# Altium footprint library SMT.PcbLib: 325 footprints (part 7 of 21)
Each footprint in its own frame and in the unit in brackets; x right, y up, seen from the top. Pads: shape width x height; smd on the part's side, far side on the other; paste and mask are expansions set on the pad; w line width, h text height; cw(c..) or ccw(c..) is an arc to the next point about the centre after c.
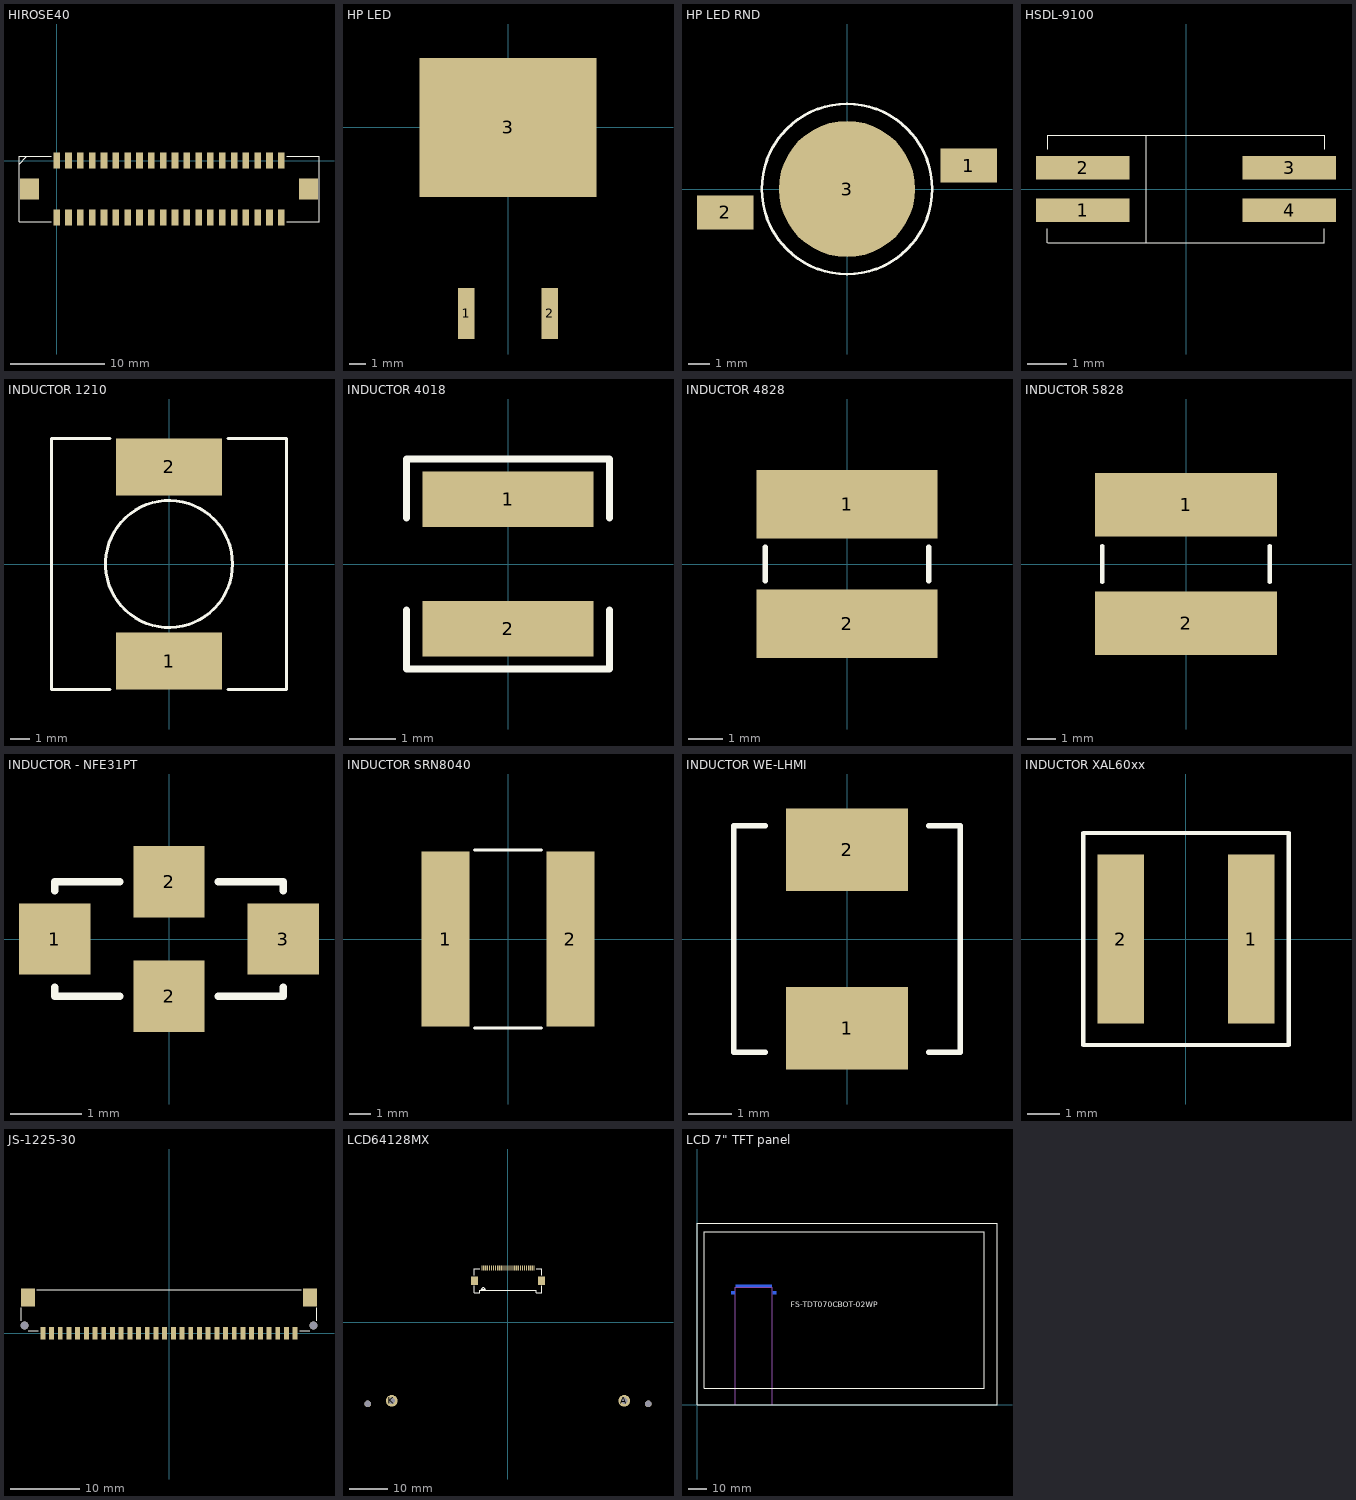
[diagram p6: the footprints below, top view; thin cyan lines are the x and y axes]

## HIROSE40 [mm]
pads (42):
  rect 0.7x1.7 smd: 1(0,0) 2(0,-6) 3(1.25,0) 4(1.25,-6) 5(2.5,0) 6(2.5,-6) 7(3.75,0) 8(3.75,-6) 9(5,0) 10(5,-6) 11(6.25,0) 12(6.25,-6) 13(7.5,0) 14(7.5,-6) 15(8.75,0) 16(8.75,-6) 17(10,0) 18(10,-6) 19(11.25,0) 20(11.25,-6) 21(12.5,0) 22(12.5,-6) 23(13.75,0) 24(13.75,-6) 25(15,0) 26(15,-6) 27(16.25,0) 28(16.25,-6) 29(17.5,0) 30(17.5,-6) 31(18.75,0) 32(18.75,-6) 33(20,0) 34(20,-6) 35(21.25,0) 36(21.25,-6) 37(22.5,0) 38(22.5,-6) 39(23.75,0) 40(23.75,-6)
  rect 2x2.2 smd: ""(-2.86,-3) ""(26.6,-3)
TopOverlay:
  lines w0.127: -3.99,-0.36 -3.18,0.45 ; -0.56,-6.45 -3.99,-6.45 -3.99,0.45 -0.56,0.45 ; 24.3,-6.45 27.73,-6.45 27.73,0.45 24.3,0.45

## HP LED [mm]
pads (3):
  rect 1x3.1 smd: 1(-2.54,-11.25) 2(2.54,-11.25)
  rect 10.7x8.4 smd: 3(0,0)

## HP LED RND [mm]
pads (3):
  rect 2.65x1.6 smd: 1(5.72,1.1) 2(-5.72,-1.1)
  round 6.4 smd: 3(0,0)
TopOverlay:
  circle w0.127: c0,0 r4

## HSDL-9100 [mm] "Surface-Mount Proximity Sensor"
height 2.7
pads (4):
  rect 2.4x0.6 smd: 1(-2.65,-0.55) 2(-2.65,0.55) 3(2.65,0.55) 4(2.65,-0.55)
TopOverlay:
  lines w0.025: -3.556,-1.375 -3.556,-1.016 ; -3.55,-1.375 0,-1.375 3.55,-1.375 ; -3.55,1.375 0,1.375 3.55,1.375 ; -3.544,1.016 -3.544,1.375 ; -1.016,-1.375 -1.016,1.375 ; 3.544,-1.375 3.544,-1.016 ; 3.556,1.016 3.556,1.375

## INDUCTOR 1210 [mm] "SIZE 1210"
height 0.254
pads (2):
  rect 5.4x2.9 smd: 1(0,-4.95) 2(0,4.95)
TopOverlay:
  circle w0.152: c0,0 r3.239
  lines w0.152: -3,-6.4 -6,-6.4 -6,6.4 -3,6.4 ; 3,-6.4 6,-6.4 6,6.4 3,6.4
3D body "STEP-WE-PD-1210-rev1.stp": height 10.43, standoff 0.05, extent -6,-6 6,6

## INDUCTOR 4018 [mm] "SMD SIZE 54018"
height 3.9
pads (2):
  rect 3.7x1.2 smd: 1(0,1.4) 2(0,-1.4)
TopOverlay:
  lines w0.152: -2.2,-1 -2.2,-2.275 2.2,-2.275 2.2,-1 ; -2.2,1 -2.2,2.275 2.2,2.275 2.2,1
3D body: height 2.8, standoff 0, extent -2,-2 2,2

## INDUCTOR 4828 [mm] "SMD 744043101 SIZE 5828"
height 2.8
pads (2):
  rect 5.3x2 smd: 1(0,1.75) 2(0,-1.75)
TopOverlay:
  lines w0.152: -2.4,-0.5 -2.4,0 -2.4,0.5 ; 2.4,-0.5 2.4,0 2.4,0.5
3D body: height 2.8, standoff 0, extent -2.4,-2.4 2.4,2.4

## INDUCTOR 5828 [mm] "SMD 744053221 SIZE 5828"
height 2.8
pads (2):
  rect 6.3x2.2 smd: 1(0,2.05) 2(0,-2.05)
TopOverlay:
  lines w0.152: -2.9,-0.625 -2.9,0 -2.9,0.625 ; 2.9,-0.625 2.9,0 2.9,0.625
3D body: height 2.8, standoff 0, extent -2.9,-2.9 2.9,2.9

## INDUCTOR - NFE31PT [mm] "NFE31PT (1206)"
pads (4):
  rect 1x1 smd: 1(-1.6,0) 2(0,-0.8) 2(0,0.8) 3(1.6,0)
TopOverlay:
  lines w0.102: -1.6,-0.675 -1.6,-0.8 -0.686,-0.8 ; -1.6,0.675 -1.6,0.8 -0.686,0.8 ; 0.686,-0.8 1.6,-0.8 1.6,-0.675 ; 0.686,0.8 1.6,0.8 1.6,0.675
3D body: height 1.4, standoff 0.2, extent -1.6,-0.598 1.6,0.598
3D body: height 1.6, standoff 0, extent -1.6,-0.794 -0.9,0.8
3D body: height 1.6, standoff 0, extent 0.9,-0.797 1.6,0.797
3D body: height 1.6, standoff 0, extent -0.508,-0.8 0.508,0.8

## INDUCTOR SRN8040 [mm] "BOURNS SRN8040 SERIES"
height 4
pads (2):
  rect 2.2x8 smd: 1(-2.85,0) 2(2.85,0)
TopOverlay:
  lines w0.127: -1.524,-4.064 1.524,-4.064 ; -1.524,4.064 1.524,4.064

## INDUCTOR WE-LHMI [mm]
height 1.8
pads (2):
  rect 2.8x1.9 smd: 1(0,-2.05) 2(0,2.05)
TopOverlay:
  lines w0.127: -1.875,-2.6 -2.6,-2.6 -2.6,0 -2.6,2.6 -1.875,2.6 ; 1.875,-2.6 2.6,-2.6 2.6,0 2.6,2.6 1.875,2.6
3D body: height 1.8, standoff 0, extent -2.6,-2.6 2.6,2.6

## INDUCTOR XAL60xx [mm]
height 6.1
pads (2):
  rect 1.43x5.24 smd: 1(2.02,0) 2(-2.02,0)
TopOverlay:
  lines w0.127: -3.18,-3.28 -3.18,3.28 0,3.28 3.18,3.28 3.18,-3.28 0,-3.28 -3.18,-3.28
3D body: height 6.1, standoff 0, extent -3.18,-3.28 3.18,3.28

## JS-1225-30 [mm] "LVDS HEADER 30 WAY"
height 2.5
pads (34):
  rect 0.7x1.8 smd: 1(18.125,0) 2(16.875,0) 3(15.625,0) 4(14.375,0) 5(13.125,0) 6(11.875,0) 7(10.625,0) 8(9.375,0) 9(8.125,0) 10(6.875,0) 11(5.625,0) 12(4.375,0) 13(3.125,0) 14(1.875,0) 15(0.625,0) 16(-0.625,0) 17(-1.875,0) 18(-3.125,0) 19(-4.375,0) 20(-5.625,0) 21(-6.875,0) 22(-8.125,0) 23(-9.375,0) 24(-10.625,0) 25(-11.875,0) 26(-13.125,0) 27(-14.375,0) 28(-15.625,0) 29(-16.875,0) 30(-18.125,0)
  round 1.1 hole 1.1 unplated: ""(-20.75,1.1) ""(20.75,1.1)
  rect 2x2.6 smd: ""(-20.25,5.1) ""(20.25,5.1)
TopOverlay:
  lines w0.152: -21.25,1.75 -21.25,3.625 ; -20.25,0.375 -18.75,0.375 ; -19,6.25 19,6.25 ; 18.75,0.375 20.25,0.375 ; 21.25,1.75 21.25,3.625

## L298P [mm] "PowerS020"
height 3.6

## LCD64128MX [mm] "DISPLAYTECH 64X128 GRAPHIC LCD"
height 6.5
pads (34):
  rect 0.3x1.3 smd: 1(-6.75,13.993) 2(-6.25,13.993) 3(-5.75,13.993) 4(-5.25,13.993) 5(-4.75,13.993) 6(-4.25,13.993) 7(-3.75,13.993) 8(-3.25,13.993) 9(-2.75,13.993) 10(-2.25,13.993) 11(-1.75,13.993) 12(-1.25,13.993) 13(-0.75,13.993) 14(-0.25,13.993) 15(0.25,13.993) 16(0.75,13.993) 17(1.25,13.993) 18(1.75,13.993) 19(2.25,13.993) 20(2.75,13.993) 21(3.25,13.993) 22(3.75,13.993) 23(4.25,13.993) 24(4.75,13.993) 25(5.25,13.993) 26(5.75,13.993) 27(6.25,13.993) 28(6.75,13.993)
  round 3 hole 1.6: A(30,-20.293) K(-30,-20.293)
  round 1.7 hole 1.7 unplated: ""(-36.2,-21.093) ""(36.2,-21.093)
  rect 1.8x2.2 smd: ""(-8.65,10.743) ""(8.65,10.743)
TopOverlay:
  lines w0.127: -8.65,9.368 -8.65,7.643 -7.25,7.643 ; -8.65,12.118 -8.65,13.843 -7.25,13.843 ; 7.25,13.843 8.65,13.843 8.65,12.118 ; 8.65,9.368 8.65,7.643 7.25,7.643 ; -7.25,7.643 -7.25,8.243 7.25,8.243 7.25,7.643 ; -7.25,7.643 -7.25,7.643 ; -6.375,8.993 -6.875,8.493 -5.875,8.493 -6.375,8.993 ; -6.375,8.993 -6.375,8.993 ; 7.25,7.643 7.25,7.643
BottomOverlay:
  lines w0.127: -38.7,-24.093 38.7,-24.093 38.7,28.307 -38.7,28.307 -38.7,-24.093 ; -33.26,-11.013 -33.26,22.227 0,22.227 33.26,22.227 33.26,-11.013 -33.26,-11.013

## LCD 7" TFT panel [mm] "TST070CBOT-02WP"
height 4.7
pads (42):
  rect 0.295x1.3 smd far side: 1(21.435,65.55) 2(21.935,65.55) 3(22.435,65.55) 4(22.935,65.55) 5(23.435,65.55) 6(23.935,65.55) 7(24.435,65.55) 8(24.935,65.55) 9(25.435,65.55) 10(25.935,65.55) 11(26.435,65.55) 12(26.935,65.55) 13(27.435,65.55) 14(27.935,65.55) 15(28.435,65.55) 16(28.935,65.55) 17(29.435,65.55) 18(29.935,65.55) 19(30.435,65.55) 20(30.935,65.55) 21(31.435,65.55) 22(31.935,65.55) 23(32.435,65.55) 24(32.935,65.55) 25(33.435,65.55) 26(33.935,65.55) 27(34.435,65.55) 28(34.935,65.55) 29(35.435,65.55) 30(35.935,65.55) 31(36.435,65.55) 32(36.935,65.55) 33(37.435,65.55) 34(37.935,65.55) 35(38.435,65.55) 36(38.935,65.55) 37(39.435,65.55) 38(39.935,65.55) 39(40.435,65.55) 40(40.935,65.55)
  rect 1.7x1.5 smd far side: ""(19.785,61.65) ""(42.585,61.65)
TopOverlay:
  lines w0.127: 0,0 164.9,0 164.9,100 0,100 0,0 ; 3.96,9.3 80.96,9.3 157.96,9.3 157.96,52.26 157.96,95.22 80.96,95.22 3.96,95.22 3.96,52.26 3.96,9.3
  text "FS-TDT070CBOT-02WP" at 51.475,53.625 h3.05
BottomOverlay:
  lines w0.127: 19.435,60.7 20.885,60.7 20.885,60.925 41.485,60.925 41.485,60.7 42.935,60.7 ; 19.435,62.675 19.435,65.475 19.56,65.6 20.185,65.6 20.185,65.175 20.935,65.175 ; 19.435,63.45 31.185,63.45 42.935,63.45 ; 19.435,64.8 20.935,64.8 ; 40.185,60.925 40.685,61.425 ; 41.185,60.925 40.685,61.425 ; 41.435,64.8 42.935,64.8 ; 41.435,65.175 42.185,65.175 42.185,65.6 42.81,65.6 42.935,65.475 42.935,62.675 ; 40.685,61.425 40.685,61.425
Mechanical15:
  lines w0.127: 20.96,0 20.96,64.8 41.46,64.8 41.46,0